# Altium footprint library Electronic Devices_LIB.PcbLib: 410 footprints (part 19 of 26)
Each footprint in its own frame and in the unit in brackets; x right, y up, seen from the top. Pads: shape width x height; smd on the part's side, far side on the other; paste and mask are expansions set on the pad; w line width, h text height; cw(c..) or ccw(c..) is an arc to the next point about the centre after c.
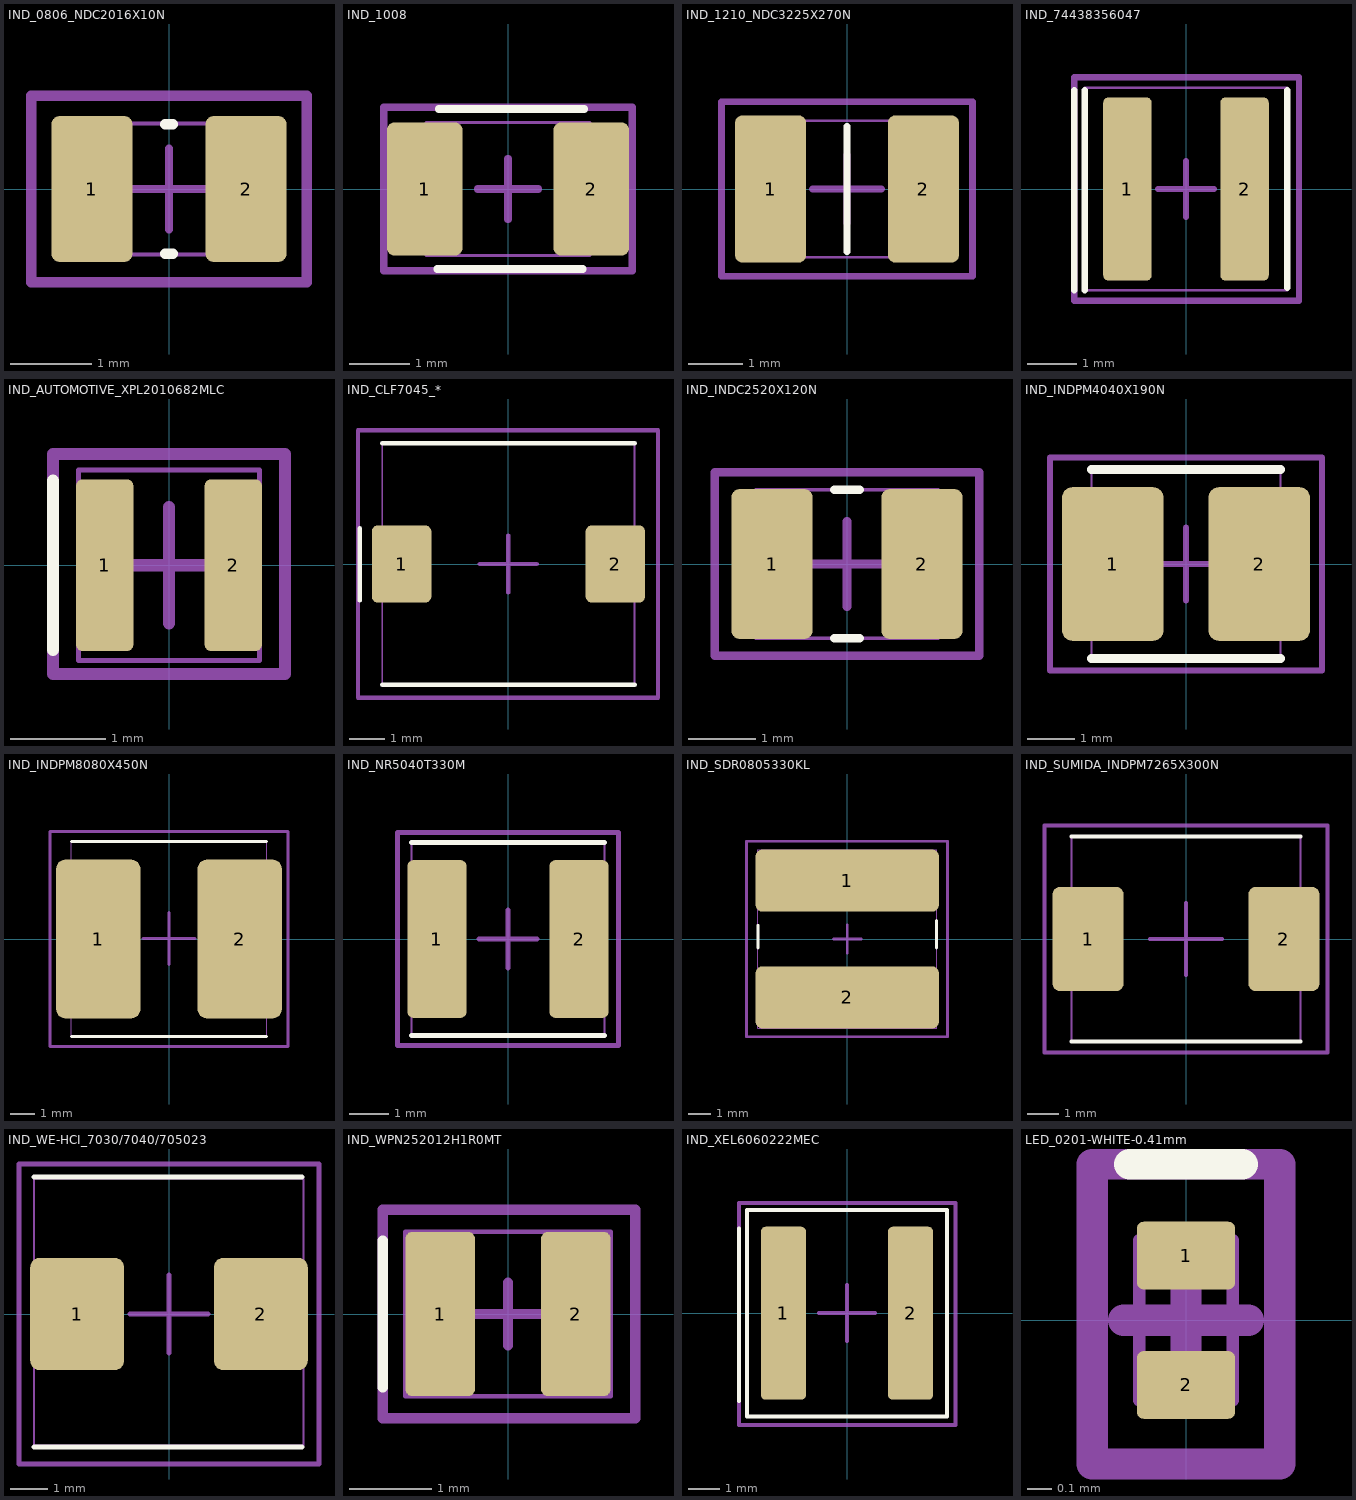
[diagram p18: the footprints below, top view; thin cyan lines are the x and y axes]

## IND_0806_NDC2016X10N [mm] "Chip Inductor, 2-Leads, Body 2.01x1.61mm, IPC Medium Density"
height 1
pads (2):
  rrect20% 1x1.8 smd: 1(-0.95,0) 2(0.95,0)
Top Overlay:
  lines w0.127: -0.05,-0.8 0.05,-0.8 ; -0.05,0.8 0.05,0.8
Top Assembly:
  lines w0.051: -1.01,-0.81 1.01,-0.81 1.01,0.81 -1.01,0.81 -1.01,-0.81
  text ".Designator" at -2.489,-0.237 h0.51
Top Courtyard:
  lines w0.1: -0.5,0 0.5,0 ; 0,-0.5 0,0.5
  lines w0.127: -1.7,-1.15 1.7,-1.15 1.7,1.15 -1.7,1.15 -1.7,-1.15
3D body "IIND_0806_NDC2016X10N.step": height 1, standoff 0, extent -1.01,-0.81 1.01,0.81

## IND_1008 [mm] "Chip Inductor, 2-Leads, Body 2.5x2.0x1.1 mm"
height 1.1
pads (2):
  rrect20% 1.25x2.2 smd: 1(-1.375,0) 2(1.375,0)
Top Overlay:
  lines w0.127: -1.168,-1.321 1.232,-1.321 ; -1.143,1.321 1.257,1.321
Top Assembly:
  lines w0.051: -1.35,-1.1 -1.35,1.1 1.35,1.1 1.35,-1.1 -1.35,-1.1
  text ".Designator" at -2.438,-0.085 h0.51
Top Courtyard:
  lines w0.127: -0.5,0 0.5,0 ; 0,-0.5 0,0.5 ; -2.05,-1.35 2.05,-1.35 2.05,1.35 -2.05,1.35 -2.05,-1.35
3D body "74479787147.stp": height 0.89, standoff -0.01, extent -1.25,-1 1.25,1

## IND_1210_NDC3225X270N [mm]
pads (2):
  rrect20% 1.3x2.7 smd: 1(-1.4,0) 2(1.4,0)
Top Overlay:
  lines w0.127: 0,-1.15 0,1.15
Top Assembly:
  lines w0.051: -1.6,-1.25 1.6,-1.25 1.6,1.25 -1.6,1.25 -1.6,-1.25
  text ".Designator" at -2.489,-0.263 h0.51
Top Courtyard:
  lines w0.127: -0.635,0 0,0 ; 0,-0.635 0,0 ; 0,0.635 0,0 ; 0.635,0 0,0 ; -2.3,-1.6 2.3,-1.6 2.3,1.6 -2.3,1.6 -2.3,-1.6
3D body "CBC3225T101MR.stp": height 2.7, standoff 0, extent -1.6,-1.25 1.6,1.25

## IND_74438356047 [mm] "0.161\" L x 0.161\" W (4.10mm x 4.10mm)"
height 2.1
pads (2):
  rrect20% 0.98x3.7 smd: 1(-1.185,0) 2(1.185,0)
Top Overlay:
  lines w0.127: -2.261,-2.05 -2.261,2 ; -2.05,-2.05 -2.05,2 ; 2.05,-2 2.05,2
Top Assembly:
  lines w0.051: -2.05,-2.05 -2.05,2.05 2.05,2.05 2.05,-2.05 -2.05,-2.05
  text ".Designator" at -2.515,-0.186 h0.51
Top Courtyard:
  lines w0.127: -0.559,0 0,0 ; 0,-0.559 0,0 ; 0,0.559 0,0 ; 0.559,0 0,0 ; -2.261,-2.261 2.286,-2.261 2.286,2.261 -2.261,2.261 -2.261,-2.261
3D body "744383560056.stp": height 2.2, standoff 0, extent -2.05,-2.05 2.05,2.05

## IND_AUTOMOTIVE_XPL2010682MLC [mm]
pads (2):
  rrect20% 0.6x1.8 smd: 1(-0.675,0) 2(0.675,0)
Top Overlay:
  lines w0.127: -1.219,-0.889 -1.219,0.889
Top Assembly:
  lines w0.051: -0.95,-1 0.95,-1 0.95,1 -0.95,1 -0.95,-1
  text ".Designator" at -2.565,-0.11 h0.51
Top Courtyard:
  lines w0.127: -0.61,0 0,0 ; 0,-0.61 0,0 ; 0,0.61 0,0 ; 0.61,0 0,0 ; -1.219,-1.143 1.219,-1.143 1.219,1.168 -1.219,1.168 -1.219,-1.143
3D body "XPL2010-682MLC.stp": height 1.1, standoff 0, extent -0.95,-1 0.95,1

## IND_CLF7045_* [mm] "0.291\" L x 0.276\" W (7.40mm x 7.00mm)"
height 4.8
pads (2):
  rrect20% 1.7x2.2 smd: 1(-3.05,0) 2(3.05,0)
Top Overlay:
  lines w0.127: -4.242,-1.041 -4.242,1.016 ; -3.6,-3.45 3.6,-3.45 ; -3.6,3.45 3.6,3.45
Top Assembly:
  lines w0.051: -3.6,-3.45 3.6,-3.45 3.6,3.45 -3.6,3.45 -3.6,-3.45
  text ".Designator" at -2.464,-0.11 h0.51
Top Courtyard:
  lines w0.127: -0.813,0 0,0 ; 0,-0.813 0,0 ; 0,0.813 0,0 ; 0.813,0 0,0 ; -4.293,-3.81 -4.293,3.81 4.267,3.81 4.267,-3.81 -4.293,-3.81
3D body "CLF7045NIT-331M-D.stp": height 4.8, standoff 0, extent -3.797,-3.601 3.803,3.599

## IND_INDC2520X120N [mm]
pads (2):
  rrect20% 1.2x2.22 smd: 1(-1.11,0) 2(1.11,0)
Top Overlay:
  lines w0.127: -0.19,-1.1 0.19,-1.1 ; -0.19,1.1 0.19,1.1
Top Assembly:
  lines w0.051: -1.35,-1.1 -1.35,1.1 1.35,1.1 1.35,-1.1 -1.35,-1.1
  text ".Designator" at -2.565,-0.136 h0.51
Top Courtyard:
  lines w0.127: -0.635,0 0,0 ; 0,-0.635 0,0 ; 0,0.635 0,0 ; 0.635,0 0,0 ; -1.958,-1.358 -1.958,1.358 1.958,1.358 1.958,-1.358 -1.958,-1.358
3D body "MAMK2520H1R5M.STEP": height 1.2, standoff 0, extent -1.25,-1 1.25,1

## IND_INDPM4040X190N [mm] "0.157\" L x 0.157\" W (4.00mm x 4.00mm)"
height 1.9
pads (2):
  rrect20% 2.15x3.25 smd: 1(-1.55,0) 2(1.55,0)
Top Overlay:
  lines w0.2: -2,-2 2,-2 ; -2,2 2,2
Top Assembly:
  lines w0.051: -2,-2 -2,2 2,2 2,-2 -2,-2
  text ".Designator" at -2.574,-0.13 h0.51
Top Courtyard:
  lines w0.127: -0.775,0 0,0 ; 0,-0.775 0,0 ; 0,0.775 0,0 ; 0.775,0 0,0 ; -2.875,-2.25 2.875,-2.25 2.875,2.25 -2.875,2.25 -2.875,-2.25
3D body "IFSC1515AHER2R2M01.stp": height 1.71, standoff 0, extent -1.975,-1.975 1.975,1.975

## IND_INDPM8080X450N [mm] "0.315\" L x 0.315\" W (8.00mm x 8.00mm)"
height 4.5
pads (2):
  rrect20% 3.45x6.5 smd: 1(-2.9,0) 2(2.9,0)
Top Overlay:
  lines w0.127: -4,-4 4,-4 ; -4,4 4,4
Top Assembly:
  lines w0.051: -4,-4 -4,4 4,4 4,-4 -4,-4
  text ".Designator" at -2.515,-0.161 h0.51
Top Courtyard:
  lines w0.127: -1.067,0.025 0,0.025 ; 0,-1.041 0,0.025 ; 0,1.092 0,0.025 ; 1.067,0.025 0,0.025 ; -4.875,-4.4 -4.875,4.4 4.875,4.4 4.875,-4.4 -4.875,-4.4
3D body "SRN8040TA-4R7M.stp": height 4.5, standoff 0, extent -4,-4 4,4

## IND_NR5040T330M [mm] "0.193\" L x 0.193\" W (4.90mm x 4.90mm)"
height 4
pads (2):
  rrect20% 1.5x4 smd: 1(-1.8,0) 2(1.8,0)
Top Overlay:
  lines w0.127: -2.45,-2.45 2.45,-2.45 ; -2.45,2.45 2.45,2.45
Top Assembly:
  lines w0.051: -2.45,-2.45 -2.45,2.45 2.45,2.45 2.45,-2.45 -2.45,-2.45
  text ".Designator" at -2.667,-0.034 h0.51
Top Courtyard:
  lines w0.127: -0.737,0 0,0 ; 0,-0.737 0,0 ; 0,0.737 0,0 ; 0.737,0 0,0 ; -2.8,-2.7 -2.8,2.7 2.8,2.7 2.8,-2.7 -2.8,-2.7
3D body "step_temp.STEP": height 4.01, standoff 0.01, extent -2.45,-2.45 2.45,2.45

## IND_SDR0805330KL [mm] "0.307\" L x 0.307\" W (7.80mm x 7.80mm)"
height 5.3
pads (2):
  rrect20% 8x2.7 smd: 1(0,2.55) 2(0,-2.55)
Top Overlay:
  lines w0.127: -3.9,-0.4 -3.9,0.6 ; 3.9,-0.4 3.9,0.8
Top Assembly:
  lines w0.051: -3.9,-3.9 3.9,-3.9 3.9,3.9 -3.9,3.9 -3.9,-3.9
  text ".Designator" at -2.464,-0.186 h0.51
Top Courtyard:
  lines w0.127: -0.61,0 0,0 ; 0,-0.61 0,0 ; 0,0.61 0,0 ; 0.61,0 0,0 ; -4.394,-4.267 -4.394,4.267 4.369,4.267 4.369,-4.267 -4.394,-4.267
3D body "SDR0805-330KL.stp": height 5.3, standoff 0, extent -3.9,-3.9 3.9,3.9

## IND_SUMIDA_INDPM7265X300N [mm]
pads (2):
  rrect20% 2.25x3.3 smd: 1(-3.1,0) 2(3.1,0)
Top Overlay:
  lines w0.127: -3.625,-3.25 3.625,-3.25 ; -3.625,3.25 3.625,3.25
Top Assembly:
  lines w0.051: -3.625,-3.25 3.625,-3.25 3.625,3.25 -3.625,3.25 -3.625,-3.25
  text ".Designator" at -2.616,-0.263 h0.51
Top Courtyard:
  lines w0.127: -1.143,0 0,0 ; 0,-1.143 0,0 ; 0,1.143 0,0 ; 1.143,0 0,0 ; -4.475,-3.6 -4.475,3.6 4.475,3.6 4.475,-3.6 -4.475,-3.6
3D body "CDMC6D28NP-1R0MC.stp": height 3, standoff 0, extent -3.625,-3.25 3.625,3.25

## IND_WE-HCI_7030/7040/705023 [mm] "0.276\" L x 0.272\" W (7.00mm x 6.90mm)"
height 4
pads (2):
  rrect20% 2.5x3 smd: 1(-2.45,0) 2(2.45,0)
Top Overlay:
  lines w0.127: -3.6,-3.55 3.55,-3.55 ; -3.6,3.65 3.55,3.65
Top Assembly:
  lines w0.051: -3.607,3.607 3.581,3.607 3.581,-3.5 ; -3.6,-3.5 -3.6,3.6 ; -3.581,-3.505 3.581,-3.505
  text ".Designator" at -2.362,-0.212 h0.51
Top Courtyard:
  lines w0.127: -1.041,0 0,0 ; 0,-1.041 0,0 ; 0,1.041 0,0 ; 1.041,0 0,0 ; -4,-4 4,-4 4,4 -4,4 -4,-4
3D body "744311150.stp": height 4.8, standoff 0.01, extent -3.5,-3.45 3.5,3.45

## IND_WPN252012H1R0MT [mm] "0.098\" L x 0.079\" W (2.50mm x 2.00mm)"
height 1.2
pads (2):
  rrect20% 0.85x2 smd: 1(-0.825,0) 2(0.825,0)
Top Overlay:
  lines w0.127: -1.524,-0.889 -1.524,0.889
Top Assembly:
  lines w0.051: -1.25,-1 -1.25,1 1.25,1 1.25,-1 -1.25,-1
Top Courtyard:
  lines w0.127: -0.381,0 0,0 ; 0,-0.381 0,0 ; 0,0.381 0,0 ; 0.381,0 0,0 ; -1.524,-1.27 1.549,-1.27 1.549,1.27 -1.524,1.27 -1.524,-1.27
3D body "WPN252012H1R0MT.stp": height 1.3, standoff 0, extent -1.25,-1 1.25,1

## IND_XEL6060222MEC [mm] "0.258\" L x 0.250\" W (6.56mm x 6.36mm)"
height 6.1
pads (2):
  rrect20% 1.43x5.5 smd: 1(-2.02,0) 2(2.02,0)
Top Overlay:
  lines w0.127: -3.429,-2.794 -3.429,2.692 ; -3.18,-3.28 -3.18,3.28 3.18,3.28 3.18,-3.28 -3.18,-3.28
Top Assembly:
  lines w0.051: -3.18,-3.28 -3.18,3.28 3.18,3.28 3.18,-3.28 -3.18,-3.28
  text ".Designator" at -2.21,0.169 h0.51
Top Courtyard:
  lines w0.127: -0.889,0 0,0 ; 0,-0.889 0,0 ; 0,0.889 0,0 ; 0.889,0 0,0 ; -3.429,-3.556 -3.429,3.505 3.454,3.505 3.454,-3.556 -3.429,-3.556
3D body "XEL6060-222MEC.stp": height 6.2, standoff 0, extent -3.18,-3.28 3.18,3.28

## LED_0201-WHITE-0.41mm [mm] "2-SMD, No Lead, 0.65mm L x 0.38mm W"
height 0.41
pads (2):
  rrect20% 0.4x0.275 smd: 1(0,0.263) 2(0,-0.263)
Top Overlay:
  lines w0.127: -0.229,0.635 0.229,0.635
Top Assembly:
  lines w0.051: -0.19,-0.325 -0.19,0.325 0.19,0.325 0.19,-0.325 -0.19,-0.325
  text ".Designator" at 0.186,-2.743 h0.51
Top Courtyard:
  lines w0.127: -0.254,0 0,0 ; 0,-0.254 0,0 ; 0,0.254 0,0 ; 0.254,0 0,0 ; -0.381,-0.584 -0.381,0.635 0.381,0.635 0.381,-0.584 -0.381,-0.584
3D body "IN-S21AT5UW.stp": height 0.34, standoff -0.03, extent -0.17,-0.32 0.21,0.33